# Altium footprint library PcbLib1.PcbLib: 150 footprints (part 10 of 10)
Each footprint in its own frame and in the unit in brackets; x right, y up, seen from the top. Pads: shape width x height; smd on the part's side, far side on the other; paste and mask are expansions set on the pad; w line width, h text height; cw(c..) or ccw(c..) is an arc to the next point about the centre after c.
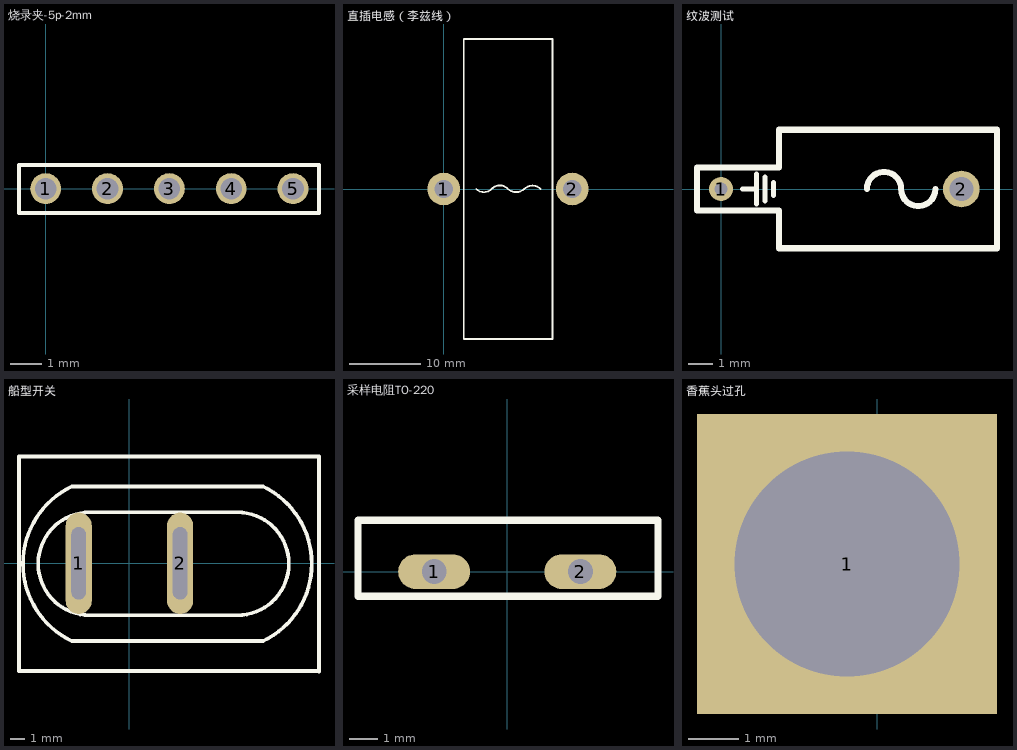
[diagram p9: the footprints below, top view; thin cyan lines are the x and y axes]

## 烧录夹-5p-2mm [mm]
pads (5):
  round 1 hole 0.7: 1(0,0) 2(2,0) 3(4,0) 4(6,0) 5(8,0)
Top Overlay:
  lines w0.127: -0.864,-0.787 8.839,-0.787 8.839,0.762 -0.406,0.762 -0.864,0.762 -0.864,-0.787

## 直插电感（李兹线） [mil]
pads (2):
  round 180 hole 100: 1(0,0) 2(708.66,0)
Top Overlay:
  lines w10: 178.9,0 ccw(c221.4,42.5) 263.9,0 cw(c308.9,-40) 348.9,5 ccw(c398.9,50) 443.9,0 cw(c488.9,-45) 533.9,0 ; 110,-826.77 110,826.77 600,826.77 600,-826.77 110,-826.77

## 纹波测试 [mm]
pads (2):
  round 1 hole 0.55: 1(0,0)
  round 1.524 hole 1: 2(10,0)
Top Overlay:
  lines w0.203: 0.889,0 1.422,0 1.473,0 ; 1.473,-0.635 1.473,0 ; 1.473,0.635 1.473,0 ; 1.829,-0.508 1.829,0 1.829,0.508 ; 2.184,-0.279 2.184,0 2.184,0.279
  lines w0.254: 6.071,0 cw(c6.782,0) 7.493,0 ccw(c8.204,0) 8.915,0 ; -1,-0.9 -1,0.9 2.413,0.9 2.413,2.464 11.481,2.464 11.481,-2.464 2.413,-2.464 2.413,-0.9 -1,-0.9

## 船型开关 [mm]
pads (2):
  oval 1.8x7 hole 1 slot 5 at 90 deg: 1(-3.5,0) 2(3.5,0)
Top Overlay:
  lines w0.254: -2.74,3.522 7.7,3.522 ; -2.74,3.522 ccw(c-2.74,-0.034) -2.74,-3.59 7.446,-3.59 ccw(c7.446,-0.034) 7.446,3.522 ; 13.08,-7.468 13.08,7.332 ; 13.08,-7.434 -7.62,-7.434 -7.62,7.366 13.08,7.366 ; -3.984,-5.368 cw(c-1.427,-0.034) -3.984,5.3 9.224,5.3 cw(c6.667,-0.034) 9.224,-5.368 -3.984,-5.368

## 采样电阻TO-220 [mm]
pads (2):
  oval 2.5x1.2 hole 0.86: 1(-2.54,0) 2(2.54,0)
Top Overlay:
  lines w0.254: -5.185,1.78 -5.185,-0.851 5.235,-0.851 5.235,1.78 -5.134,1.78

## 香蕉头过孔 [mm]
pads (1):
  rect 6x6 hole 4.5: 1(-0.61,18.669)